# Altium footprint library 容阻感.PcbLib: 66 footprints (part 2 of 5)
Each footprint in its own frame and in the unit in brackets; x right, y up, seen from the top. Pads: shape width x height; smd on the part's side, far side on the other; paste and mask are expansions set on the pad; w line width, h text height; cw(c..) or ccw(c..) is an arc to the next point about the centre after c.
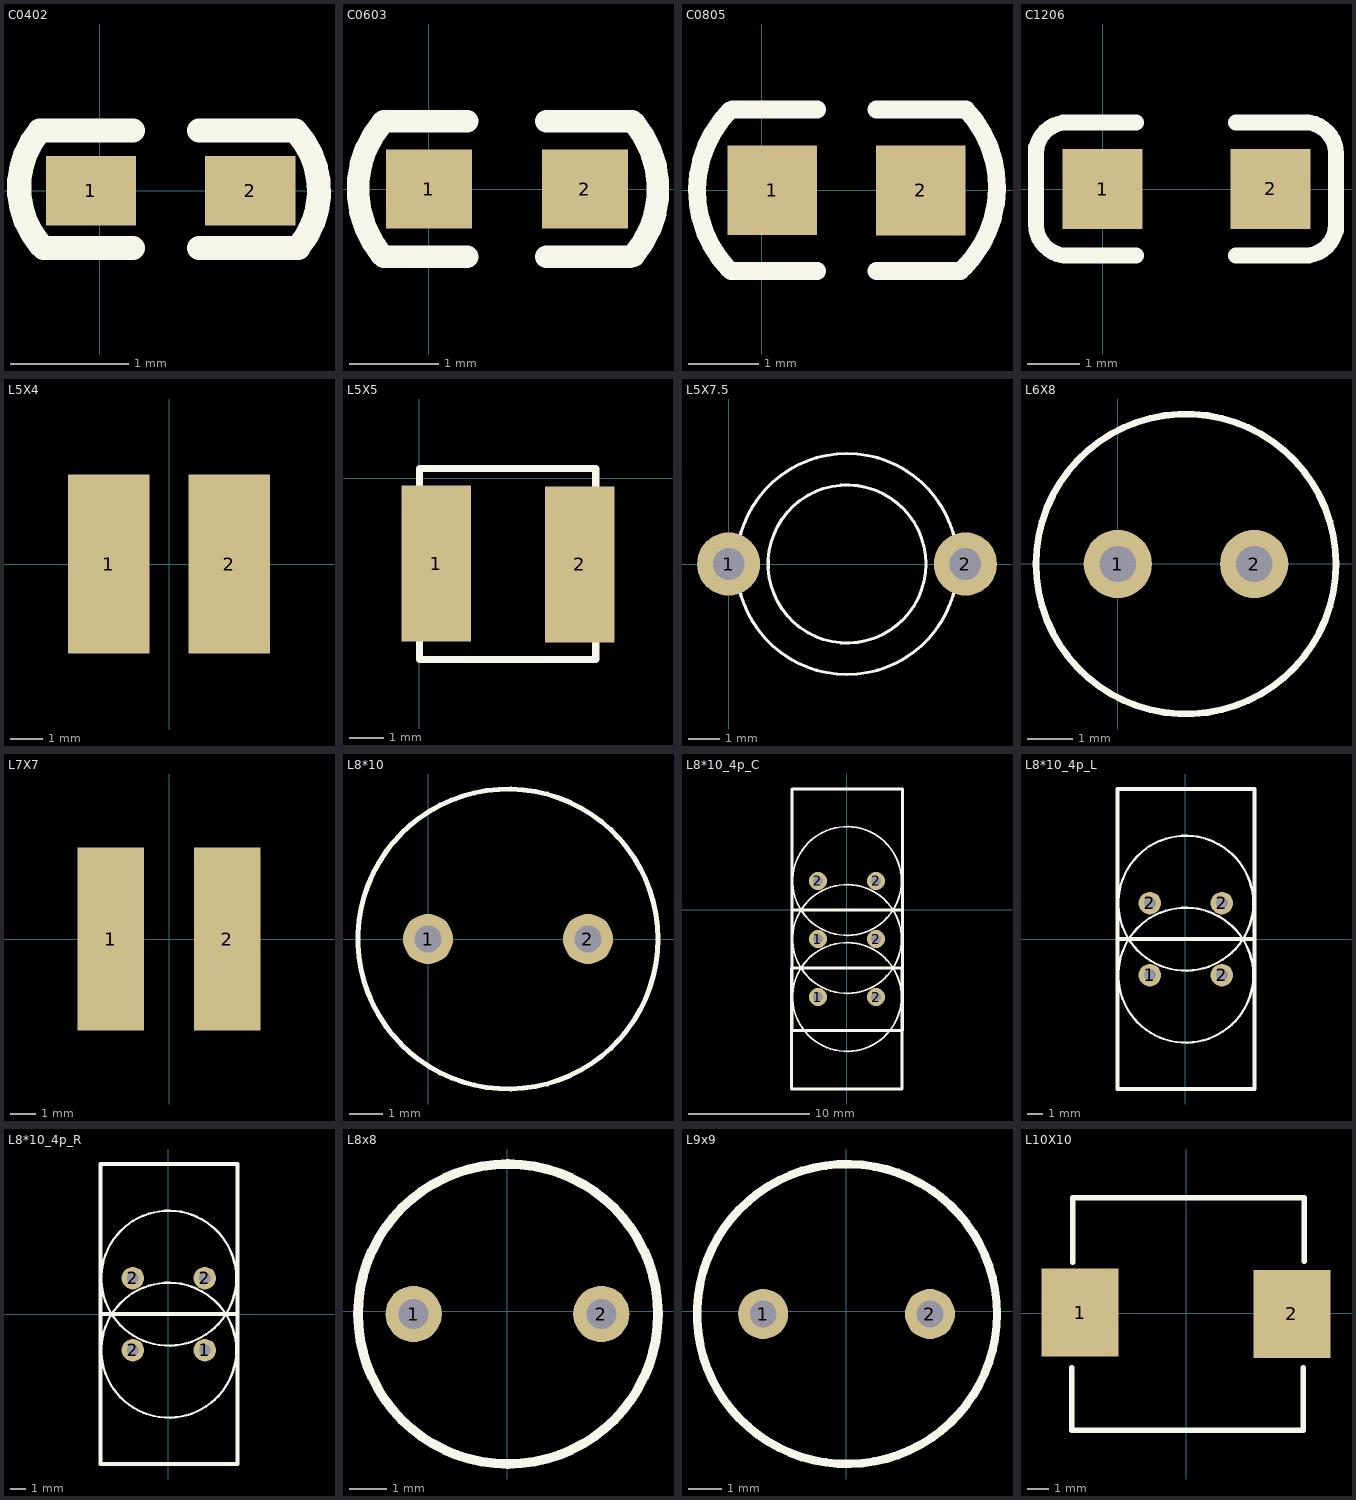
[diagram p1: the footprints below, top view; thin cyan lines are the x and y axes]

## C0402 [mil]
pads (2):
  rect 30x23 smd: 1(-3,0) 2(50,0)
Top Overlay:
  lines w8: 11,-19 -18.77,-19 -19.99,-17.78 cw(c2.37,1.12) -20,20 11,20 ; 33,-19 65.95,-19 ; 33,20 65,20 cw(c43.58,0.05) 65.95,-18.84
3D body "cap_0402.STEP": height 19.68, standoff 0, extent 2.31,-10 41.69,9.69

## C0603 [mil]
pads (2):
  rect 38x35 smd: 1(0,0) 2(69,0)
Top Overlay:
  lines w10: -21,-29 cw(c14.45,-0.04) -20.48,29.56 ; -20,-30 17,-30 ; -20,30 17,30 ; 52,-30 89,-30 ; 52,30 90,30 ; 90.48,-29.56 ccw(c55.55,0.04) 91,29
3D body "User Library-0603 SMD Capacitor.STEP": height 11.89, standoff 0, extent 3.8,-15.8 66.8,15.7

## C0805 [mil]
pads (2):
  rect 50x50 smd: 1(6,0) 2(88.7,-0.1)
Top Overlay:
  lines w10: -18.66,-43.67 cw(c27.24,-0.08) -17.7,44.5 ; -17.2,-45 31,-45 ; -16.3,45 31,45 ; 64,-45 111,-45 ; 64,45 113.1,45 ; 112.92,-43.04 ccw(c67.98,1.54) 114,45
3D body "User Library-0805 SMD Capacitor.STEP": height 30.39, standoff -0.39, extent 7.93,-24.5 86.67,24.71

## C1206 [mil] "3216/A型"
pads (2):
  rect 60x60 smd: 1(0,0) 2(126,0)
Top Overlay:
  lines w11.81: -50,-26 ccw(c-26.5,-26.5) -27,-50 ; -50,27 cw(c-26.5,26.5) -26,50 ; 151,-50 ccw(c151.5,-26.5) 175,-27 ; 152,50 cw(c151.5,26.5) 175,26
  lines w12: -50,-27 -50,31 ; -29,-50 25,-50 ; -28,50 25,50 ; 100,-50 153,-50 ; 100,50 154,50 ; 175,-31 175,27
3D body "Capacitor 1206 SMD1.step": height 39.45, standoff 0, extent 0.01,-31.49 126,31.5

## L5X4 [mm]
height 4.5
pads (2):
  rect 2.5x5.5 smd: 1(-1.85,0) 2(1.85,0)
3D body "电感.STEP": height 4.5, standoff -0.01, extent -2.857,-2.6 2.857,2.6

## L5X5 [mm]
pads (2):
  rect 2x4.5 smd: 1(0.483,-2.464) 2(4.623,-2.489)
Top Overlay:
  lines w0.203: 0,-5.232 5.08,-5.232 5.08,0.279 0,0.279 0,-5.232
3D body "CDRH4D28.step": height 2.91, standoff 0, extent 0.065,-4.914 4.965,-0.014

## L5X7.5 [mm]
pads (2):
  round 2 hole 1: 1(0,0) 2(7.5,0)
Top Overlay:
  circle w0.1: c3.75,0 r3.5
  circle w0.1: c3.75,0 r2.5
3D body "变?": height 15, standoff -7.6, extent -1.088,-4.313 8.588,4.685

## L6X8 [mm]
pads (2):
  round 1.5 hole 0.8: 1(0,0) 2(3,0)
Top Overlay:
  circle w0.15: c1.5,0 r3.3
3D body "6-8.STEP": height 8, standoff -3.7, extent -1.5,-3 4.5,3

## L7X7 [mm] "POWER INDUCTOR 5uH"
pads (2):
  rect 2.65x7.3 smd: 1(-2.325,0) 2(2.325,0)
3D body "SUMIDA-CDRH6D28.STEP": height 2.9, standoff 0, extent -3.36,-3.33 3.34,3.37

## L8*10 [mm]
pads (2):
  round 1.5 hole 0.8: 1(0,0) 2(4.8,0)
Top Overlay:
  circle w0.15: c2.4,0 r4.5
3D body "User Library-inductor-1.STEP": height 10.92, standoff -7, extent -1.1,-3.5 5.9,3.5

## L8*10_4p_C [mm]
pads (6):
  round 1.5 hole 0.8: 1(-2.377,-7.213) 1(-2.377,-2.413) 2(-2.377,2.387) 2(2.423,-7.213) 2(2.423,-2.413) 2(2.423,2.387)
Top Overlay:
  circle w0.15: c0.023,2.387 r4.5
  circle w0.15: c0.023,-2.413 r4.5
  circle w0.15: c0.023,-7.213 r4.5
  lines w0.254: -4.562,-14.826 -4.562,-4.826 ; -4.536,-10 -4.536,0 ; -4.49,-14.826 4.582,-14.826 4.582,-4.826 -4.49,-4.826 ; -4.464,-10 4.608,-10 4.608,0 4.608,10 ; 4.536,0 -4.536,0 ; 4.536,10 -4.536,10 -4.536,0
3D body "User Library-inductor-1.STEP": height 10.92, standoff -7, extent -3.477,-5.913 3.523,1.087

## L8*10_4p_L [mm]
pads (4):
  round 1.5 hole 0.8: 1(-2.377,-2.413) 2(-2.377,2.387) 2(2.423,-2.413) 2(2.423,2.387)
Top Overlay:
  circle w0.15: c0.023,-2.413 r4.5
  circle w0.15: c0.023,2.387 r4.5
  lines w0.254: -4.536,-10 -4.536,0 ; -4.464,-10 4.608,-10 4.608,0 4.608,10 ; 4.536,0 -4.536,0 ; 4.536,10 -4.536,10 -4.536,0
3D body "User Library-inductor-1.STEP": height 10.92, standoff -7, extent -3.477,-5.913 3.523,1.087

## L8*10_4p_R [mm]
pads (4):
  round 1.5 hole 0.8: 1(2.423,-2.413) 2(-2.377,-2.413) 2(-2.377,2.387) 2(2.423,2.387)
Top Overlay:
  circle w0.15: c0.023,2.387 r4.5
  circle w0.15: c0.023,-2.413 r4.5
  lines w0.254: -4.536,-10 -4.536,0 ; -4.464,-10 4.608,-10 4.608,0 4.608,10 ; 4.536,0 -4.536,0 ; 4.536,10 -4.536,10 -4.536,0
3D body "User Library-inductor-1.STEP": height 10.92, standoff -7, extent -3.477,-5.913 3.523,1.087

## L8x8 [mm] "L?"
pads (2):
  round 1.5 hole 0.8: 1(-2.489,-0.076) 2(2.515,-0.076)
Top Overlay:
  circle w0.254: c0.025,-0.076 r4
3D body "Inductor.step": height 11.2, standoff -5, extent -4.134,-4.236 4.166,4.064

## L9x9 [mm] "L?"
pads (2):
  round 1.5 hole 0.8: 1(-2.489,-0.076) 2(2.515,-0.076)
Top Overlay:
  circle w0.254: c0.025,-0.076 r4.5
3D body "RLB9012-222KL Radial Inductor [Bourns] (Pitch 0_7mm).step": height 11.8, standoff -30, extent -4.526,-4.649 4.474,4.351

## L10X10 [mil]
pads (2):
  rect 140x160 smd: 1(-192.08,1.25) 2(192.08,-1.25)
Top Overlay:
  lines w10: -207.08,-98.75 -207.08,-212.08 212.92,-212.08 212.92,-98.75 ; -205.42,92.92 -205.42,209.58 214.58,209.58 214.58,94.58
3D body: height 157.48, standoff 0, extent -207,-213 215,211